# Altium footprint library Connectors SMD.PcbLib: 130 footprints (part 9 of 12)
Each footprint in its own frame and in the unit in brackets; x right, y up, seen from the top. Pads: shape width x height; smd on the part's side, far side on the other; paste and mask are expansions set on the pad; w line width, h text height; cw(c..) or ccw(c..) is an arc to the next point about the centre after c.
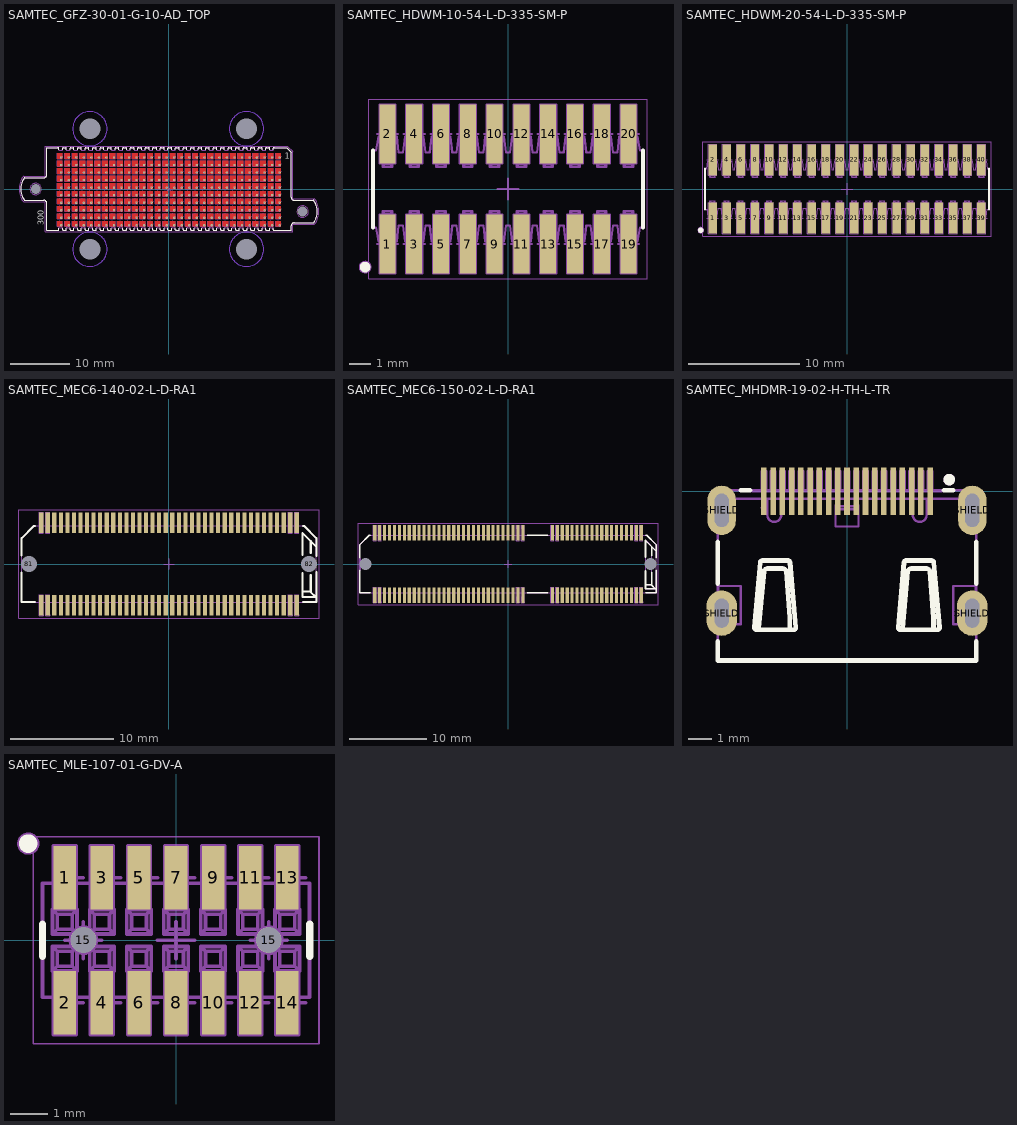
[diagram p8: the footprints below, top view; thin cyan lines are the x and y axes]

## SAMTEC_GFZ-30-01-G-10-AD_TOP [mm] "Z-Beam, High Speed 300 Pins, Pitch 1.27mm, Low Profile 1.65mm, Grid Array (30x10) Solderless SMT Board Stacking Connector"
height 1.65
pads (306):
  round 0.4 hole 0.2: 1(18.656,5.318) 2(18.656,4.048) 3(18.656,2.778) 4(18.656,1.508) 5(18.656,0.238) 6(18.656,-1.032) 7(18.656,-2.302) 8(18.656,-3.572) 9(18.656,-4.842) 10(18.656,-6.112) 11(17.386,5.318) 12(17.386,4.048) 13(17.386,2.778) 14(17.386,1.508) 15(17.386,0.238) 16(17.386,-1.032) 17(17.386,-2.302) 18(17.386,-3.572) 19(17.386,-4.842) 20(17.386,-6.112) 21(16.116,5.318) 22(16.116,4.048) 23(16.116,2.778) 24(16.116,1.508) 25(16.116,0.238) 26(16.116,-1.032) 27(16.116,-2.302) 28(16.116,-3.572) 29(16.116,-4.842) 30(16.116,-6.112) 31(14.825,5.3) 32(14.825,4.048) 33(14.825,2.778) 34(14.825,1.508) 35(14.825,0.238) 36(14.825,-1.032) 37(14.825,-2.302) 38(14.825,-3.572) 39(14.825,-4.842) 40(14.825,-6.112) 41(13.576,5.318) 42(13.576,4.048) 43(13.576,2.778) 44(13.576,1.508) 45(13.576,0.238) 46(13.576,-1.032) 47(13.576,-2.302) 48(13.576,-3.572) 49(13.576,-4.842) 50(13.576,-6.112) 51(12.306,5.318) 52(12.306,4.048) 53(12.306,2.778) 54(12.306,1.508) 55(12.306,0.238) 56(12.306,-1.032) 57(12.306,-2.302) 58(12.306,-3.572) 59(12.306,-4.842) 60(12.306,-6.112) 61(11.036,5.318) 62(11.036,4.048) 63(11.036,2.778) 64(11.036,1.508) 65(11.036,0.238) 66(11.036,-1.032) 67(11.036,-2.302) 68(11.036,-3.572) 69(11.036,-4.842) 70(11.036,-6.112) 71(9.766,5.318) 72(9.766,4.048) 73(9.766,2.778) 74(9.766,1.508) 75(9.766,0.238) 76(9.766,-1.032) 77(9.766,-2.302) 78(9.766,-3.572) 79(9.766,-4.842) 80(9.766,-6.112) 81(8.496,5.318) 82(8.496,4.048) 83(8.496,2.778) 84(8.496,1.508) 85(8.496,0.238) 86(8.496,-1.032) 87(8.496,-2.302) 88(8.496,-3.572) 89(8.496,-4.842) 90(8.496,-6.112) 91(7.226,5.318) 92(7.226,4.048) 93(7.226,2.778) 94(7.226,1.508) 95(7.226,0.238) 96(7.226,-1.032) 97(7.226,-2.302) 98(7.226,-3.572) 99(7.226,-4.842) 100(7.226,-6.112) 101(5.956,5.318) 102(5.956,4.048) 103(5.956,2.778) 104(5.956,1.508) 105(5.956,0.238) 106(5.956,-1.032) 107(5.956,-2.302) 108(5.956,-3.572) 109(5.956,-4.842) 110(5.956,-6.112) 111(4.686,5.318) 112(4.686,4.048) 113(4.686,2.778) 114(4.686,1.508) 115(4.686,0.238) 116(4.686,-1.032) 117(4.686,-2.302) 118(4.686,-3.572) 119(4.686,-4.842) 120(4.686,-6.112) 121(3.416,5.318) 122(3.416,4.048) 123(3.416,2.778) 124(3.416,1.508) 125(3.416,0.238) 126(3.416,-1.032) 127(3.416,-2.302) 128(3.416,-3.572) 129(3.416,-4.842) 130(3.416,-6.112) 131(2.146,5.318) 132(2.146,4.048) 133(2.146,2.778) 134(2.146,1.508) 135(2.146,0.238) 136(2.146,-1.032) 137(2.146,-2.302) 138(2.146,-3.572) 139(2.146,-4.842) 140(2.146,-6.112) 141(0.876,5.318) 142(0.876,4.048) 143(0.876,2.778) 144(0.876,1.508) 145(0.876,0.238) 146(0.876,-1.032) 147(0.876,-2.302) 148(0.876,-3.572) 149(0.876,-4.842) 150(0.876,-6.112) 151(-0.394,5.318) 152(-0.394,4.048) 153(-0.394,2.778) 154(-0.394,1.508) 155(-0.394,0.238) 156(-0.394,-1.032) 157(-0.394,-2.302) 158(-0.394,-3.572) 159(-0.394,-4.842) 160(-0.394,-6.112) 161(-1.664,5.318) 162(-1.664,4.048) 163(-1.664,2.778) 164(-1.664,1.508) 165(-1.664,0.238) 166(-1.664,-1.032) 167(-1.664,-2.302) 168(-1.664,-3.572) 169(-1.664,-4.842) 170(-1.664,-6.112) 171(-2.934,5.318) 172(-2.934,4.048) 173(-2.934,2.778) 174(-2.934,1.508) 175(-2.934,0.238) 176(-2.934,-1.032) 177(-2.934,-2.302) 178(-2.934,-3.572) 179(-2.934,-4.842) 180(-2.934,-6.112) 181(-4.204,5.318) 182(-4.204,4.048) 183(-4.204,2.778) 184(-4.204,1.508) 185(-4.204,0.238) 186(-4.204,-1.032) 187(-4.204,-2.302) 188(-4.204,-3.572) 189(-4.204,-4.842) 190(-4.204,-6.112) 191(-5.474,5.318) 192(-5.474,4.048) 193(-5.474,2.778) 194(-5.474,1.508) 195(-5.474,0.238) 196(-5.474,-1.032) 197(-5.474,-2.302) 198(-5.474,-3.572) 199(-5.474,-4.842) 200(-5.474,-6.112) 201(-6.744,5.318) 202(-6.744,4.048) 203(-6.744,2.778) 204(-6.744,1.508) 205(-6.744,0.238) 206(-6.744,-1.032) 207(-6.744,-2.302) 208(-6.744,-3.572) 209(-6.744,-4.842) 210(-6.744,-6.112) 211(-8.014,5.318) 212(-8.014,4.048) 213(-8.014,2.778) 214(-8.014,1.508) 215(-8.014,0.238) 216(-8.014,-1.032) 217(-8.014,-2.302) 218(-8.014,-3.572) 219(-8.014,-4.842) 220(-8.014,-6.112) 221(-9.284,5.318) 222(-9.284,4.048) 223(-9.284,2.778) 224(-9.284,1.508) 225(-9.284,0.238) 226(-9.284,-1.032) 227(-9.284,-2.302) 228(-9.284,-3.572) 229(-9.284,-4.842) 230(-9.284,-6.112) 231(-10.554,5.318) 232(-10.554,4.048) 233(-10.554,2.778) 234(-10.554,1.508) 235(-10.554,0.238) 236(-10.554,-1.032) 237(-10.554,-2.302) 238(-10.554,-3.572) 239(-10.554,-4.842) 240(-10.554,-6.112) 241(-11.824,5.318) 242(-11.824,4.048) 243(-11.824,2.778) 244(-11.824,1.508) 245(-11.824,0.238) 246(-11.824,-1.032) 247(-11.824,-2.302) 248(-11.824,-3.572) 249(-11.824,-4.842) 250(-11.824,-6.112) 251(-13.094,5.318) 252(-13.094,4.048) 253(-13.094,2.778) 254(-13.094,1.508) 255(-13.094,0.238) 256(-13.094,-1.032) 257(-13.094,-2.302) 258(-13.094,-3.572) 259(-13.094,-4.842) 260(-13.094,-6.112) 261(-14.364,5.318) 262(-14.364,4.048) 263(-14.364,2.778) 264(-14.364,1.508) 265(-14.364,0.238) 266(-14.364,-1.032) 267(-14.364,-2.302) 268(-14.364,-3.572) 269(-14.364,-4.842) 270(-14.364,-6.112) 271(-15.634,5.318) 272(-15.634,4.048) 273(-15.634,2.778) 274(-15.634,1.508) 275(-15.634,0.238) 276(-15.634,-1.032) 277(-15.634,-2.302) 278(-15.634,-3.572) 279(-15.634,-4.842) 280(-15.634,-6.112) 281(-16.904,5.318) 282(-16.904,4.048) 283(-16.904,2.778) 284(-16.904,1.508) 285(-16.904,0.238) 286(-16.904,-1.032) 287(-16.904,-2.302) 288(-16.904,-3.572) 289(-16.904,-4.842) 290(-16.904,-6.112) 291(-18.174,5.318) 292(-18.174,4.048) 293(-18.174,2.778) 294(-18.174,1.508) 295(-18.174,0.238) 296(-18.174,-1.032) 297(-18.174,-2.302) 298(-18.174,-3.572) 299(-18.174,-4.842) 300(-18.174,-6.112)
  round 1 hole 1.65 unplated mask+0.325: MEC1(-22.479,0) MEC2(22.53,-3.81)
  round 1 hole 3.5 unplated mask+1.25: MEC3(-13.339,10.16) MEC4(13.081,10.16) MEC5(-13.339,-10.16) MEC6(13.081,-10.16)
Top Layer:
  region: -18.864,6.008 -17.974,6.008 -17.974,5.118 -18.864,5.118
  region: -18.864,4.738 -17.974,4.738 -17.974,3.848 -18.864,3.848
  region: -18.864,3.468 -17.974,3.468 -17.974,2.578 -18.864,2.578
  region: -18.864,2.198 -17.974,2.198 -17.974,1.308 -18.864,1.308
  region: -18.864,0.928 -17.974,0.928 -17.974,0.038 -18.864,0.038
  region: -18.864,-0.342 -17.974,-0.342 -17.974,-1.232 -18.864,-1.232
  region: -18.864,-1.612 -17.974,-1.612 -17.974,-2.502 -18.864,-2.502
  region: -18.864,-2.882 -17.974,-2.882 -17.974,-3.772 -18.864,-3.772
  region: -18.864,-4.152 -17.974,-4.152 -17.974,-5.042 -18.864,-5.042
  region: -18.864,-5.422 -17.974,-5.422 -17.974,-6.312 -18.864,-6.312
  region: -17.594,6.008 -16.704,6.008 -16.704,5.118 -17.594,5.118
  region: -17.594,4.738 -16.704,4.738 -16.704,3.848 -17.594,3.848
  region: -17.594,3.468 -16.704,3.468 -16.704,2.578 -17.594,2.578
  region: -17.594,2.198 -16.704,2.198 -16.704,1.308 -17.594,1.308
  region: -17.594,0.928 -16.704,0.928 -16.704,0.038 -17.594,0.038
  region: -17.594,-0.342 -16.704,-0.342 -16.704,-1.232 -17.594,-1.232
  region: -17.594,-1.612 -16.704,-1.612 -16.704,-2.502 -17.594,-2.502
  region: -17.594,-2.882 -16.704,-2.882 -16.704,-3.772 -17.594,-3.772
  region: -17.594,-4.152 -16.704,-4.152 -16.704,-5.042 -17.594,-5.042
  region: -17.594,-5.422 -16.704,-5.422 -16.704,-6.312 -17.594,-6.312
  region: -16.324,6.008 -15.434,6.008 -15.434,5.118 -16.324,5.118
  region: -16.324,4.738 -15.434,4.738 -15.434,3.848 -16.324,3.848
  region: -16.324,3.468 -15.434,3.468 -15.434,2.578 -16.324,2.578
  region: -16.324,2.198 -15.434,2.198 -15.434,1.308 -16.324,1.308
  region: -16.324,0.928 -15.434,0.928 -15.434,0.038 -16.324,0.038
  region: -16.324,-0.342 -15.434,-0.342 -15.434,-1.232 -16.324,-1.232
  region: -16.324,-1.612 -15.434,-1.612 -15.434,-2.502 -16.324,-2.502
  region: -16.324,-2.882 -15.434,-2.882 -15.434,-3.772 -16.324,-3.772
  region: -16.324,-4.152 -15.434,-4.152 -15.434,-5.042 -16.324,-5.042
  region: -16.324,-5.422 -15.434,-5.422 -15.434,-6.312 -16.324,-6.312
  region: -15.054,6.008 -14.164,6.008 -14.164,5.118 -15.054,5.118
  region: -15.054,4.738 -14.164,4.738 -14.164,3.848 -15.054,3.848
  region: -15.054,3.468 -14.164,3.468 -14.164,2.578 -15.054,2.578
  region: -15.054,2.198 -14.164,2.198 -14.164,1.308 -15.054,1.308
  region: -15.054,0.928 -14.164,0.928 -14.164,0.038 -15.054,0.038
  region: -15.054,-0.342 -14.164,-0.342 -14.164,-1.232 -15.054,-1.232
  region: -15.054,-1.612 -14.164,-1.612 -14.164,-2.502 -15.054,-2.502
  region: -15.054,-2.882 -14.164,-2.882 -14.164,-3.772 -15.054,-3.772
  region: -15.054,-4.152 -14.164,-4.152 -14.164,-5.042 -15.054,-5.042
  region: -15.054,-5.422 -14.164,-5.422 -14.164,-6.312 -15.054,-6.312
  region: -13.784,6.008 -12.894,6.008 -12.894,5.118 -13.784,5.118
  region: -13.784,4.738 -12.894,4.738 -12.894,3.848 -13.784,3.848
  region: -13.784,3.468 -12.894,3.468 -12.894,2.578 -13.784,2.578
  region: -13.784,2.198 -12.894,2.198 -12.894,1.308 -13.784,1.308
  region: -13.784,0.928 -12.894,0.928 -12.894,0.038 -13.784,0.038
  region: -13.784,-0.342 -12.894,-0.342 -12.894,-1.232 -13.784,-1.232
  region: -13.784,-1.612 -12.894,-1.612 -12.894,-2.502 -13.784,-2.502
  region: -13.784,-2.882 -12.894,-2.882 -12.894,-3.772 -13.784,-3.772
  region: -13.784,-4.152 -12.894,-4.152 -12.894,-5.042 -13.784,-5.042
  region: -13.784,-5.422 -12.894,-5.422 -12.894,-6.312 -13.784,-6.312
  region: -12.514,6.008 -11.624,6.008 -11.624,5.118 -12.514,5.118
  region: -12.514,4.738 -11.624,4.738 -11.624,3.848 -12.514,3.848
  region: -12.514,3.468 -11.624,3.468 -11.624,2.578 -12.514,2.578
  region: -12.514,2.198 -11.624,2.198 -11.624,1.308 -12.514,1.308
  region: -12.514,0.928 -11.624,0.928 -11.624,0.038 -12.514,0.038
  region: -12.514,-0.342 -11.624,-0.342 -11.624,-1.232 -12.514,-1.232
  region: -12.514,-1.612 -11.624,-1.612 -11.624,-2.502 -12.514,-2.502
  region: -12.514,-2.882 -11.624,-2.882 -11.624,-3.772 -12.514,-3.772
  region: -12.514,-4.152 -11.624,-4.152 -11.624,-5.042 -12.514,-5.042
  region: -12.514,-5.422 -11.624,-5.422 -11.624,-6.312 -12.514,-6.312
  region: -11.244,6.008 -10.354,6.008 -10.354,5.118 -11.244,5.118
  region: -11.244,4.738 -10.354,4.738 -10.354,3.848 -11.244,3.848
  region: -11.244,3.468 -10.354,3.468 -10.354,2.578 -11.244,2.578
  region: -11.244,2.198 -10.354,2.198 -10.354,1.308 -11.244,1.308
  region: -11.244,0.928 -10.354,0.928 -10.354,0.038 -11.244,0.038
  region: -11.244,-0.342 -10.354,-0.342 -10.354,-1.232 -11.244,-1.232
  region: -11.244,-1.612 -10.354,-1.612 -10.354,-2.502 -11.244,-2.502
  region: -11.244,-2.882 -10.354,-2.882 -10.354,-3.772 -11.244,-3.772
  region: -11.244,-4.152 -10.354,-4.152 -10.354,-5.042 -11.244,-5.042
  region: -11.244,-5.422 -10.354,-5.422 -10.354,-6.312 -11.244,-6.312
  region: -9.974,6.008 -9.084,6.008 -9.084,5.118 -9.974,5.118
  region: -9.974,4.738 -9.084,4.738 -9.084,3.848 -9.974,3.848
  region: -9.974,3.468 -9.084,3.468 -9.084,2.578 -9.974,2.578
  region: -9.974,2.198 -9.084,2.198 -9.084,1.308 -9.974,1.308
  region: -9.974,0.928 -9.084,0.928 -9.084,0.038 -9.974,0.038
  region: -9.974,-0.342 -9.084,-0.342 -9.084,-1.232 -9.974,-1.232
  region: -9.974,-1.612 -9.084,-1.612 -9.084,-2.502 -9.974,-2.502
  region: -9.974,-2.882 -9.084,-2.882 -9.084,-3.772 -9.974,-3.772
  region: -9.974,-4.152 -9.084,-4.152 -9.084,-5.042 -9.974,-5.042
  region: -9.974,-5.422 -9.084,-5.422 -9.084,-6.312 -9.974,-6.312
  region: -8.704,6.008 -7.814,6.008 -7.814,5.118 -8.704,5.118
  region: -8.704,4.738 -7.814,4.738 -7.814,3.848 -8.704,3.848
  region: -8.704,3.468 -7.814,3.468 -7.814,2.578 -8.704,2.578
  region: -8.704,2.198 -7.814,2.198 -7.814,1.308 -8.704,1.308
  region: -8.704,0.928 -7.814,0.928 -7.814,0.038 -8.704,0.038
  region: -8.704,-0.342 -7.814,-0.342 -7.814,-1.232 -8.704,-1.232
  region: -8.704,-1.612 -7.814,-1.612 -7.814,-2.502 -8.704,-2.502
  region: -8.704,-2.882 -7.814,-2.882 -7.814,-3.772 -8.704,-3.772
  region: -8.704,-4.152 -7.814,-4.152 -7.814,-5.042 -8.704,-5.042
  region: -8.704,-5.422 -7.814,-5.422 -7.814,-6.312 -8.704,-6.312
  region: -7.434,6.008 -6.544,6.008 -6.544,5.118 -7.434,5.118
  region: -7.434,4.738 -6.544,4.738 -6.544,3.848 -7.434,3.848
  region: -7.434,3.468 -6.544,3.468 -6.544,2.578 -7.434,2.578
  region: -7.434,2.198 -6.544,2.198 -6.544,1.308 -7.434,1.308
  region: -7.434,0.928 -6.544,0.928 -6.544,0.038 -7.434,0.038
  region: -7.434,-0.342 -6.544,-0.342 -6.544,-1.232 -7.434,-1.232
  region: -7.434,-1.612 -6.544,-1.612 -6.544,-2.502 -7.434,-2.502
  region: -7.434,-2.882 -6.544,-2.882 -6.544,-3.772 -7.434,-3.772
  region: -7.434,-4.152 -6.544,-4.152 -6.544,-5.042 -7.434,-5.042
  region: -7.434,-5.422 -6.544,-5.422 -6.544,-6.312 -7.434,-6.312
  region: 17.966,-5.422 18.856,-5.422 18.856,-6.312 17.966,-6.312
  region: 17.966,6.008 18.856,6.008 18.856,5.118 17.966,5.118
  region: 16.696,6.008 17.586,6.008 17.586,5.118 16.696,5.118
  region: 15.426,6.008 16.316,6.008 16.316,5.118 15.426,5.118
  region: 14.156,6.008 15.046,6.008 15.046,5.118 14.156,5.118
  region: 12.886,6.008 13.776,6.008 13.776,5.118 12.886,5.118
  region: 11.616,6.008 12.506,6.008 12.506,5.118 11.616,5.118
  region: 10.346,6.008 11.236,6.008 11.236,5.118 10.346,5.118
  region: 9.076,6.008 9.966,6.008 9.966,5.118 9.076,5.118
  region: 7.806,6.008 8.696,6.008 8.696,5.118 7.806,5.118
  region: 6.536,6.008 7.426,6.008 7.426,5.118 6.536,5.118
  region: 5.266,6.008 6.156,6.008 6.156,5.118 5.266,5.118
  region: 3.996,6.008 4.886,6.008 4.886,5.118 3.996,5.118
  region: 2.726,6.008 3.616,6.008 3.616,5.118 2.726,5.118
  region: 1.456,6.008 2.346,6.008 2.346,5.118 1.456,5.118
  region: 0.186,6.008 1.076,6.008 1.076,5.118 0.186,5.118
  region: -1.084,6.008 -0.194,6.008 -0.194,5.118 -1.084,5.118
  region: -2.354,6.008 -1.464,6.008 -1.464,5.118 -2.354,5.118
  region: -3.624,6.008 -2.734,6.008 -2.734,5.118 -3.624,5.118
  region: -4.894,6.008 -4.004,6.008 -4.004,5.118 -4.894,5.118
  region: -6.164,6.008 -5.274,6.008 -5.274,5.118 -6.164,5.118
  region: 17.966,4.738 18.856,4.738 18.856,3.848 17.966,3.848
  region: 16.696,4.738 17.586,4.738 17.586,3.848 16.696,3.848
  region: 15.426,4.738 16.316,4.738 16.316,3.848 15.426,3.848
  region: 14.156,4.738 15.046,4.738 15.046,3.848 14.156,3.848
  region: 12.886,4.738 13.776,4.738 13.776,3.848 12.886,3.848
  region: 11.616,4.738 12.506,4.738 12.506,3.848 11.616,3.848
  region: 10.346,4.738 11.236,4.738 11.236,3.848 10.346,3.848
  region: 9.076,4.738 9.966,4.738 9.966,3.848 9.076,3.848
  region: 7.806,4.738 8.696,4.738 8.696,3.848 7.806,3.848
  region: 6.536,4.738 7.426,4.738 7.426,3.848 6.536,3.848
  region: 5.266,4.738 6.156,4.738 6.156,3.848 5.266,3.848
  region: 3.996,4.738 4.886,4.738 4.886,3.848 3.996,3.848
  region: 2.726,4.738 3.616,4.738 3.616,3.848 2.726,3.848
  region: 1.456,4.738 2.346,4.738 2.346,3.848 1.456,3.848
  region: 0.186,4.738 1.076,4.738 1.076,3.848 0.186,3.848
  region: -1.084,4.738 -0.194,4.738 -0.194,3.848 -1.084,3.848
  region: -2.354,4.738 -1.464,4.738 -1.464,3.848 -2.354,3.848
  region: -3.624,4.738 -2.734,4.738 -2.734,3.848 -3.624,3.848
  region: -4.894,4.738 -4.004,4.738 -4.004,3.848 -4.894,3.848
  region: -6.164,4.738 -5.274,4.738 -5.274,3.848 -6.164,3.848
  region: 17.966,3.468 18.856,3.468 18.856,2.578 17.966,2.578
  region: 16.696,3.468 17.586,3.468 17.586,2.578 16.696,2.578
  region: 15.426,3.468 16.316,3.468 16.316,2.578 15.426,2.578
  region: 14.156,3.468 15.046,3.468 15.046,2.578 14.156,2.578
  region: 12.886,3.468 13.776,3.468 13.776,2.578 12.886,2.578
  region: 11.616,3.468 12.506,3.468 12.506,2.578 11.616,2.578
  region: 10.346,3.468 11.236,3.468 11.236,2.578 10.346,2.578
  region: 9.076,3.468 9.966,3.468 9.966,2.578 9.076,2.578
  region: 7.806,3.468 8.696,3.468 8.696,2.578 7.806,2.578
  region: 6.536,3.468 7.426,3.468 7.426,2.578 6.536,2.578
  region: 5.266,3.468 6.156,3.468 6.156,2.578 5.266,2.578
  region: 3.996,3.468 4.886,3.468 4.886,2.578 3.996,2.578
  region: 2.726,3.468 3.616,3.468 3.616,2.578 2.726,2.578
  region: 1.456,3.468 2.346,3.468 2.346,2.578 1.456,2.578
  region: 0.186,3.468 1.076,3.468 1.076,2.578 0.186,2.578
  region: -1.084,3.468 -0.194,3.468 -0.194,2.578 -1.084,2.578
  region: -2.354,3.468 -1.464,3.468 -1.464,2.578 -2.354,2.578
  region: -3.624,3.468 -2.734,3.468 -2.734,2.578 -3.624,2.578
  region: -4.894,3.468 -4.004,3.468 -4.004,2.578 -4.894,2.578
  region: -6.164,3.468 -5.274,3.468 -5.274,2.578 -6.164,2.578
  region: 17.966,2.198 18.856,2.198 18.856,1.308 17.966,1.308
  region: 16.696,2.198 17.586,2.198 17.586,1.308 16.696,1.308
  region: 15.426,2.198 16.316,2.198 16.316,1.308 15.426,1.308
  region: 14.156,2.198 15.046,2.198 15.046,1.308 14.156,1.308
  region: 12.886,2.198 13.776,2.198 13.776,1.308 12.886,1.308
  region: 11.616,2.198 12.506,2.198 12.506,1.308 11.616,1.308
  region: 10.346,2.198 11.236,2.198 11.236,1.308 10.346,1.308
  region: 9.076,2.198 9.966,2.198 9.966,1.308 9.076,1.308
  region: 7.806,2.198 8.696,2.198 8.696,1.308 7.806,1.308
  region: 6.536,2.198 7.426,2.198 7.426,1.308 6.536,1.308
  region: 5.266,2.198 6.156,2.198 6.156,1.308 5.266,1.308
  region: 3.996,2.198 4.886,2.198 4.886,1.308 3.996,1.308
  region: 2.726,2.198 3.616,2.198 3.616,1.308 2.726,1.308
  region: 1.456,2.198 2.346,2.198 2.346,1.308 1.456,1.308
  region: 0.186,2.198 1.076,2.198 1.076,1.308 0.186,1.308
  region: -1.084,2.198 -0.194,2.198 -0.194,1.308 -1.084,1.308
  region: -2.354,2.198 -1.464,2.198 -1.464,1.308 -2.354,1.308
  region: -3.624,2.198 -2.734,2.198 -2.734,1.308 -3.624,1.308
  region: -4.894,2.198 -4.004,2.198 -4.004,1.308 -4.894,1.308
  region: -6.164,2.198 -5.274,2.198 -5.274,1.308 -6.164,1.308
  region: 17.966,0.928 18.856,0.928 18.856,0.038 17.966,0.038
  region: 16.696,0.928 17.586,0.928 17.586,0.038 16.696,0.038
  region: 15.426,0.928 16.316,0.928 16.316,0.038 15.426,0.038
  region: 14.156,0.928 15.046,0.928 15.046,0.038 14.156,0.038
  region: 12.886,0.928 13.776,0.928 13.776,0.038 12.886,0.038
  region: 11.616,0.928 12.506,0.928 12.506,0.038 11.616,0.038
  region: 10.346,0.928 11.236,0.928 11.236,0.038 10.346,0.038
  region: 9.076,0.928 9.966,0.928 9.966,0.038 9.076,0.038
  region: 7.806,0.928 8.696,0.928 8.696,0.038 7.806,0.038
  region: 6.536,0.928 7.426,0.928 7.426,0.038 6.536,0.038
  region: 5.266,0.928 6.156,0.928 6.156,0.038 5.266,0.038
  region: 3.996,0.928 4.886,0.928 4.886,0.038 3.996,0.038
  region: 2.726,0.928 3.616,0.928 3.616,0.038 2.726,0.038
  region: 1.456,0.928 2.346,0.928 2.346,0.038 1.456,0.038
  region: 0.186,0.928 1.076,0.928 1.076,0.038 0.186,0.038
  region: -1.084,0.928 -0.194,0.928 -0.194,0.038 -1.084,0.038
  region: -2.354,0.928 -1.464,0.928 -1.464,0.038 -2.354,0.038
  region: -3.624,0.928 -2.734,0.928 -2.734,0.038 -3.624,0.038
  region: -4.894,0.928 -4.004,0.928 -4.004,0.038 -4.894,0.038
  region: -6.164,0.928 -5.274,0.928 -5.274,0.038 -6.164,0.038
  region: 17.966,-0.342 18.856,-0.342 18.856,-1.232 17.966,-1.232
  region: 16.696,-0.342 17.586,-0.342 17.586,-1.232 16.696,-1.232
  region: 15.426,-0.342 16.316,-0.342 16.316,-1.232 15.426,-1.232
  region: 14.156,-0.342 15.046,-0.342 15.046,-1.232 14.156,-1.232
  region: 12.886,-0.342 13.776,-0.342 13.776,-1.232 12.886,-1.232
  region: 11.616,-0.342 12.506,-0.342 12.506,-1.232 11.616,-1.232
  region: 10.346,-0.342 11.236,-0.342 11.236,-1.232 10.346,-1.232
  region: 9.076,-0.342 9.966,-0.342 9.966,-1.232 9.076,-1.232
  region: 7.806,-0.342 8.696,-0.342 8.696,-1.232 7.806,-1.232
  region: 6.536,-0.342 7.426,-0.342 7.426,-1.232 6.536,-1.232
  region: 5.266,-0.342 6.156,-0.342 6.156,-1.232 5.266,-1.232
  region: 3.996,-0.342 4.886,-0.342 4.886,-1.232 3.996,-1.232
  region: 2.726,-0.342 3.616,-0.342 3.616,-1.232 2.726,-1.232
  region: 1.456,-0.342 2.346,-0.342 2.346,-1.232 1.456,-1.232
  region: 0.186,-0.342 1.076,-0.342 1.076,-1.232 0.186,-1.232
  region: -1.084,-0.342 -0.194,-0.342 -0.194,-1.232 -1.084,-1.232
  region: -2.354,-0.342 -1.464,-0.342 -1.464,-1.232 -2.354,-1.232
  region: -3.624,-0.342 -2.734,-0.342 -2.734,-1.232 -3.624,-1.232
  region: -4.894,-0.342 -4.004,-0.342 -4.004,-1.232 -4.894,-1.232
  region: -6.164,-0.342 -5.274,-0.342 -5.274,-1.232 -6.164,-1.232
  region: 17.966,-1.612 18.856,-1.612 18.856,-2.502 17.966,-2.502
  region: 16.696,-1.612 17.586,-1.612 17.586,-2.502 16.696,-2.502
  region: 15.426,-1.612 16.316,-1.612 16.316,-2.502 15.426,-2.502
  region: 14.156,-1.612 15.046,-1.612 15.046,-2.502 14.156,-2.502
  region: 12.886,-1.612 13.776,-1.612 13.776,-2.502 12.886,-2.502
  region: 11.616,-1.612 12.506,-1.612 12.506,-2.502 11.616,-2.502
  region: 10.346,-1.612 11.236,-1.612 11.236,-2.502 10.346,-2.502
  region: 9.076,-1.612 9.966,-1.612 9.966,-2.502 9.076,-2.502
  region: 7.806,-1.612 8.696,-1.612 8.696,-2.502 7.806,-2.502
  region: 6.536,-1.612 7.426,-1.612 7.426,-2.502 6.536,-2.502
  region: 5.266,-1.612 6.156,-1.612 6.156,-2.502 5.266,-2.502
  region: 3.996,-1.612 4.886,-1.612 4.886,-2.502 3.996,-2.502
  region: 2.726,-1.612 3.616,-1.612 3.616,-2.502 2.726,-2.502
  region: 1.456,-1.612 2.346,-1.612 2.346,-2.502 1.456,-2.502
  region: 0.186,-1.612 1.076,-1.612 1.076,-2.502 0.186,-2.502
  region: -1.084,-1.612 -0.194,-1.612 -0.194,-2.502 -1.084,-2.502
  region: -2.354,-1.612 -1.464,-1.612 -1.464,-2.502 -2.354,-2.502
  region: -3.624,-1.612 -2.734,-1.612 -2.734,-2.502 -3.624,-2.502
  region: -4.894,-1.612 -4.004,-1.612 -4.004,-2.502 -4.894,-2.502
  region: -6.164,-1.612 -5.274,-1.612 -5.274,-2.502 -6.164,-2.502
  region: 17.966,-2.882 18.856,-2.882 18.856,-3.772 17.966,-3.772
  region: 16.696,-2.882 17.586,-2.882 17.586,-3.772 16.696,-3.772
  region: 15.426,-2.882 16.316,-2.882 16.316,-3.772 15.426,-3.772
  region: 14.156,-2.882 15.046,-2.882 15.046,-3.772 14.156,-3.772
  region: 12.886,-2.882 13.776,-2.882 13.776,-3.772 12.886,-3.772
  region: 11.616,-2.882 12.506,-2.882 12.506,-3.772 11.616,-3.772
  region: 10.346,-2.882 11.236,-2.882 11.236,-3.772 10.346,-3.772
  region: 9.076,-2.882 9.966,-2.882 9.966,-3.772 9.076,-3.772
  region: 7.806,-2.882 8.696,-2.882 8.696,-3.772 7.806,-3.772
  region: 6.536,-2.882 7.426,-2.882 7.426,-3.772 6.536,-3.772
  region: 5.266,-2.882 6.156,-2.882 6.156,-3.772 5.266,-3.772
  region: 3.996,-2.882 4.886,-2.882 4.886,-3.772 3.996,-3.772
  region: 2.726,-2.882 3.616,-2.882 3.616,-3.772 2.726,-3.772
  region: 1.456,-2.882 2.346,-2.882 2.346,-3.772 1.456,-3.772
  region: 0.186,-2.882 1.076,-2.882 1.076,-3.772 0.186,-3.772
  region: -1.084,-2.882 -0.194,-2.882 -0.194,-3.772 -1.084,-3.772
  region: -2.354,-2.882 -1.464,-2.882 -1.464,-3.772 -2.354,-3.772
  region: -3.624,-2.882 -2.734,-2.882 -2.734,-3.772 -3.624,-3.772
  region: -4.894,-2.882 -4.004,-2.882 -4.004,-3.772 -4.894,-3.772
  region: -6.164,-2.882 -5.274,-2.882 -5.274,-3.772 -6.164,-3.772
  region: 17.966,-4.152 18.856,-4.152 18.856,-5.042 17.966,-5.042
  region: 16.696,-4.152 17.586,-4.152 17.586,-5.042 16.696,-5.042
  region: 15.426,-4.152 16.316,-4.152 16.316,-5.042 15.426,-5.042
  region: 14.156,-4.152 15.046,-4.152 15.046,-5.042 14.156,-5.042
  region: 12.886,-4.152 13.776,-4.152 13.776,-5.042 12.886,-5.042
  region: 11.616,-4.152 12.506,-4.152 12.506,-5.042 11.616,-5.042
  region: 10.346,-4.152 11.236,-4.152 11.236,-5.042 10.346,-5.042
  region: 9.076,-4.152 9.966,-4.152 9.966,-5.042 9.076,-5.042
  region: 7.806,-4.152 8.696,-4.152 8.696,-5.042 7.806,-5.042
  region: 6.536,-4.152 7.426,-4.152 7.426,-5.042 6.536,-5.042
  region: 5.266,-4.152 6.156,-4.152 6.156,-5.042 5.266,-5.042
  region: 3.996,-4.152 4.886,-4.152 4.886,-5.042 3.996,-5.042
  region: 2.726,-4.152 3.616,-4.152 3.616,-5.042 2.726,-5.042
  region: 1.456,-4.152 2.346,-4.152 2.346,-5.042 1.456,-5.042
  region: 0.186,-4.152 1.076,-4.152 1.076,-5.042 0.186,-5.042
  region: -1.084,-4.152 -0.194,-4.152 -0.194,-5.042 -1.084,-5.042
  region: -2.354,-4.152 -1.464,-4.152 -1.464,-5.042 -2.354,-5.042
  region: -3.624,-4.152 -2.734,-4.152 -2.734,-5.042 -3.624,-5.042
  region: -4.894,-4.152 -4.004,-4.152 -4.004,-5.042 -4.894,-5.042
  region: -6.164,-4.152 -5.274,-4.152 -5.274,-5.042 -6.164,-5.042
  region: 16.696,-5.422 17.586,-5.422 17.586,-6.312 16.696,-6.312
  region: 15.426,-5.422 16.316,-5.422 16.316,-6.312 15.426,-6.312
  region: 14.156,-5.422 15.046,-5.422 15.046,-6.312 14.156,-6.312
  region: 12.886,-5.422 13.776,-5.422 13.776,-6.312 12.886,-6.312
  region: 11.616,-5.422 12.506,-5.422 12.506,-6.312 11.616,-6.312
  region: 10.346,-5.422 11.236,-5.422 11.236,-6.312 10.346,-6.312
  region: 9.076,-5.422 9.966,-5.422 9.966,-6.312 9.076,-6.312
  region: 7.806,-5.422 8.696,-5.422 8.696,-6.312 7.806,-6.312
  region: 6.536,-5.422 7.426,-5.422 7.426,-6.312 6.536,-6.312
  region: 5.266,-5.422 6.156,-5.422 6.156,-6.312 5.266,-6.312
  region: 3.996,-5.422 4.886,-5.422 4.886,-6.312 3.996,-6.312
  region: 2.726,-5.422 3.616,-5.422 3.616,-6.312 2.726,-6.312
  region: 1.456,-5.422 2.346,-5.422 2.346,-6.312 1.456,-6.312
  region: 0.186,-5.422 1.076,-5.422 1.076,-6.312 0.186,-6.312
  region: -1.084,-5.422 -0.194,-5.422 -0.194,-6.312 -1.084,-6.312
  region: -2.354,-5.422 -1.464,-5.422 -1.464,-6.312 -2.354,-6.312
  region: -3.624,-5.422 -2.734,-5.422 -2.734,-6.312 -3.624,-6.312
  region: -4.894,-5.422 -4.004,-5.422 -4.004,-6.312 -4.894,-6.312
  region: -6.164,-5.422 -5.274,-5.422 -5.274,-6.312 -6.164,-6.312
Bottom Layer keep-out:
  circle w0.1: c13.081,-10.16 r2.9
  circle w0.1: c13.081,10.16 r2.9
  circle w0.1: c-13.339,-10.16 r2.9
  circle w0.1: c-13.339,10.16 r2.9
Top Overlay:
  drawing of 311 lines, arcs and shapes, not listed
  text "300" at -21.131,-6.085 h1
  text "1" at 19.535,5.106 h1
Mechanical 8:
  drawing of 3026 lines, arcs and shapes, not listed
Mechanical 14:
  drawing of 487 lines, arcs and shapes, not listed
  text "300" at -21.131,-6.085 h1
  text "1" at 19.535,5.106 h1
Mechanical 15:
  lines w0.05: -24.531,-2.155 cw(c-21.869,0) -24.531,2.155 -20.849,2.155 -20.849,7.235 19.941,7.235 20.849,6.327 20.849,-1.655 24.531,-1.655 cw(c21.869,-3.81) 24.531,-5.965 20.849,-5.965 20.849,-7.235 -20.849,-7.235 -20.849,-2.155 -24.531,-2.155
3D body: height 2.92, standoff -1.27, extent -25.037,-6.985 25.037,6.985

## SAMTEC_HDWM-10-54-L-D-335-SM-P [mm] "20 Contacts - Pitch 1.27mm - Dual Row Straight SMD Micro Board Stacker"
height 11.05
pads (20):
  rect 0.76x2.79 smd: 1(-5.715,-2.615) 2(-5.715,2.615) 3(-4.445,-2.615) 4(-4.445,2.615) 5(-3.175,-2.615) 6(-3.175,2.615) 7(-1.905,-2.615) 8(-1.905,2.615) 9(-0.635,-2.615) 10(-0.635,2.615) 11(0.635,-2.615) 12(0.635,2.615) 13(1.905,-2.615) 14(1.905,2.615) 15(3.175,-2.615) 16(3.175,2.615) 17(4.445,-2.615) 18(4.445,2.615) 19(5.715,-2.615) 20(5.715,2.615)
Top Overlay:
  circle w0.25: c-6.775,-3.7 r0.125
  circle w0.25: c-6.775,-3.7 r0.125
  lines w0.2: -6.395,-1.829 -6.395,1.829 ; 6.395,-1.829 6.395,1.829
Mechanical 8:
  drawing of 164 lines, arcs and shapes, not listed
Mechanical 14:
  drawing of 343 lines, arcs and shapes, not listed
Mechanical 15:
  lines w0.05: -6.6,-4.26 6.6,-4.26 6.6,4.26 -6.6,4.26 -6.6,-4.26
3D body: height 11.05, standoff 0, extent -6.35,-3.759 6.35,3.759

## SAMTEC_HDWM-20-54-L-D-335-SM-P [mm] "40 Contacts - Pitch 1.27mm - Dual Row Straight SMD Micro Board Stacker"
height 11.05
pads (40):
  rect 0.76x2.79 smd: 1(-12.065,-2.615) 2(-12.065,2.615) 3(-10.795,-2.615) 4(-10.795,2.615) 5(-9.525,-2.615) 6(-9.525,2.615) 7(-8.255,-2.615) 8(-8.255,2.615) 9(-6.985,-2.615) 10(-6.985,2.615) 11(-5.715,-2.615) 12(-5.715,2.615) 13(-4.445,-2.615) 14(-4.445,2.615) 15(-3.175,-2.615) 16(-3.175,2.615) 17(-1.905,-2.615) 18(-1.905,2.615) 19(-0.635,-2.615) 20(-0.635,2.615) 21(0.635,-2.615) 22(0.635,2.615) 23(1.905,-2.615) 24(1.905,2.615) 25(3.175,-2.615) 26(3.175,2.615) 27(4.445,-2.615) 28(4.445,2.615) 29(5.715,-2.615) 30(5.715,2.615) 31(6.985,-2.615) 32(6.985,2.615) 33(8.255,-2.615) 34(8.255,2.615) 35(9.525,-2.615) 36(9.525,2.615) 37(10.795,-2.615) 38(10.795,2.615) 39(12.065,-2.615) 40(12.065,2.615)
Top Overlay:
  circle w0.25: c-13.125,-3.7 r0.125
  circle w0.25: c-13.125,-3.7 r0.125
  lines w0.2: -12.745,-1.829 -12.745,1.829 ; 12.745,-1.829 12.745,1.829
Mechanical 8:
  drawing of 324 lines, arcs and shapes, not listed
Mechanical 14:
  drawing of 683 lines, arcs and shapes, not listed
Mechanical 15:
  lines w0.05: -12.95,-4.26 -12.95,4.26 12.95,4.26 12.95,-4.26 -12.95,-4.26
3D body: height 11.05, standoff 0, extent -12.7,-3.759 12.7,3.759

## SAMTEC_MEC6-140-02-L-D-RA1 [mm] "80 Contacts, Pitch 0.635mm, Right Angle Micro Edge Card Socket"
height 5.78
pads (82):
  rect 0.4x2 smd mask+0: 1(-12.382,-4) 2(-12.382,4) 3(-11.747,-4) 4(-11.747,4) 5(-11.112,-4) 6(-11.112,4) 7(-10.477,-4) 8(-10.477,4) 9(-9.842,-4) 10(-9.842,4) 11(-9.207,-4) 12(-9.207,4) 13(-8.572,-4) 14(-8.572,4) 15(-7.937,-4) 16(-7.937,4) 17(-7.302,-4) 18(-7.302,4) 19(-6.667,-4) 20(-6.667,4) 21(-6.032,-4) 22(-6.032,4) 23(-5.397,-4) 24(-5.397,4) 25(-4.762,-4) 26(-4.762,4) 27(-4.127,-4) 28(-4.127,4) 29(-3.492,-4) 30(-3.492,4) 31(-2.857,-4) 32(-2.857,4) 33(-2.222,-4) 34(-2.222,4) 35(-1.587,-4) 36(-1.587,4) 37(-0.952,-4) 38(-0.952,4) 39(-0.317,-4) 40(-0.317,4) 41(0.318,-4) 42(0.318,4) 43(0.953,-4) 44(0.953,4) 45(1.588,-4) 46(1.588,4) 47(2.223,-4) 48(2.223,4) 49(2.858,-4) 50(2.858,4) 51(3.493,-4) 52(3.493,4) 53(4.128,-4) 54(4.128,4) 55(4.763,-4) 56(4.763,4) 57(5.398,-4) 58(5.398,4) 59(6.033,-4) 60(6.033,4) 61(6.668,-4) 62(6.668,4) 63(7.303,-4) 64(7.303,4) 65(7.938,-4) 66(7.938,4) 67(8.573,-4) 68(8.573,4) 69(9.208,-4) 70(9.208,4) 71(9.843,-4) 72(9.843,4) 73(10.478,-4) 74(10.478,4) 75(11.113,-4) 76(11.113,4) 77(11.748,-4) 78(11.748,4) 79(12.383,-4) 80(12.383,4)
  round 1 hole 1.55 unplated mask+0.275: 81(-13.582,0) 82(13.583,0)
Top Overlay:
  lines w0.2: -14.282,-0.816 -14.282,-3.7 -12.982,-3.7 ; -14.282,0.816 -14.282,2.5 -13.082,3.7 -12.982,3.7 ; 12.925,-2.65 13.733,-2.65 ; 12.925,-0.87 12.925,-3.2 14.208,-3.2 13.733,-2.725 13.733,-1.06 ; 12.925,0.87 12.925,3.023 14.283,1.666 ; 12.983,-3.7 14.283,-3.7 14.283,-0.792 ; 12.983,3.7 13.083,3.7 14.283,2.5 14.283,0.792 ; 13.733,1.06 13.733,2.216
Mechanical 8:
  lines w0.1: -14.082,0 -13.582,0 ; -13.582,-0.5 -13.582,0 ; -13.582,0.5 -13.582,0 ; -13.082,0 -13.582,0 ; -0.5,0 0,0 ; 0,-0.5 0,0 ; 0,0.5 0,0 ; 0.5,0 0,0 ; 13.083,0 13.583,0 ; 13.583,-0.5 13.583,0 ; 13.583,0.5 13.583,0 ; 14.083,0 13.583,0 ; -12.582,-5 -12.182,-5 ; -12.582,-5 -12.582,-3 -12.182,-3 -12.182,-5 ; -12.582,-5 -12.382,-4 -12.182,-5 ; -12.582,5 -12.182,5 ; -12.582,5 -12.582,3 -12.182,3 -12.182,5 ; -12.582,5 -12.382,4 -12.182,5 ; -11.947,-5 -11.547,-5 ; -11.947,-5 -11.947,-3 -11.547,-3 -11.547,-5 ; -11.947,-5 -11.747,-4 -11.547,-5 ; -11.947,5 -11.547,5 ; -11.947,5 -11.947,3 -11.547,3 -11.547,5 ; -11.947,5 -11.747,4 -11.547,5 ; 11.548,-5 11.948,-5 ; 11.548,-5 11.548,-3 11.948,-3 11.948,-5 ; 11.548,-5 11.748,-4 11.948,-5 ; 11.548,5 11.948,5 ; 11.548,5 11.548,3 11.948,3 11.948,5 ; 11.548,5 11.748,4 11.948,5 ; 12.183,-5 12.583,-5 ; 12.183,-5 12.183,-3 12.583,-3 12.583,-5 ; 12.183,-5 12.383,-4 12.583,-5 ; 12.183,5 12.583,5 ; 12.183,5 12.183,3 12.583,3 12.583,5 ; 12.183,5 12.383,4 12.583,5
Mechanical 14:
  lines w0.1: -14.282,-3.7 -14.282,2.5 -13.082,3.7 13.083,3.7 14.283,2.5 14.283,-3.7 -14.282,-3.7
Mechanical 15:
  lines w0.05: -14.532,-5.25 -14.532,5.25 14.533,5.25 14.533,-5.25 -14.532,-5.25
3D body: height 5.77, standoff -1.05, extent -14.282,-4.55 14.283,4.55

## SAMTEC_MEC6-150-02-L-D-RA1 [mm] "100 Contacts, Pitch 0.635mm, Right Angle Micro Edge Card Socket"
height 5.78
pads (102):
  rect 0.4x2 smd mask+0: 1(-17.145,-4) 2(-17.145,4) 3(-16.51,-4) 4(-16.51,4) 5(-15.875,-4) 6(-15.875,4) 7(-15.24,-4) 8(-15.24,4) 9(-14.605,-4) 10(-14.605,4) 11(-13.97,-4) 12(-13.97,4) 13(-13.335,-4) 14(-13.335,4) 15(-12.7,-4) 16(-12.7,4) 17(-12.065,-4) 18(-12.065,4) 19(-11.43,-4) 20(-11.43,4) 21(-10.795,-4) 22(-10.795,4) 23(-10.16,-4) 24(-10.16,4) 25(-9.525,-4) 26(-9.525,4) 27(-8.89,-4) 28(-8.89,4) 29(-8.255,-4) 30(-8.255,4) 31(-7.62,-4) 32(-7.62,4) 33(-6.985,-4) 34(-6.985,4) 35(-6.35,-4) 36(-6.35,4) 37(-5.715,-4) 38(-5.715,4) 39(-5.08,-4) 40(-5.08,4) 41(-4.445,-4) 42(-4.445,4) 43(-3.81,-4) 44(-3.81,4) 45(-3.175,-4) 46(-3.175,4) 47(-2.54,-4) 48(-2.54,4) 49(-1.905,-4) 50(-1.905,4) 51(-1.27,-4) 52(-1.27,4) 53(-0.635,-4) 54(-0.635,4) 55(0,-4) 56(0,4) 57(0.635,-4) 58(0.635,4) 59(1.27,-4) 60(1.27,4) 61(1.905,-4) 62(1.905,4) 63(5.715,-4) 64(5.715,4) 65(6.35,-4) 66(6.35,4) 67(6.985,-4) 68(6.985,4) 69(7.62,-4) 70(7.62,4) 71(8.255,-4) 72(8.255,4) 73(8.89,-4) 74(8.89,4) 75(9.525,-4) 76(9.525,4) 77(10.16,-4) 78(10.16,4) 79(10.795,-4) 80(10.795,4) 81(11.43,-4) 82(11.43,4) 83(12.065,-4) 84(12.065,4) 85(12.7,-4) 86(12.7,4) 87(13.335,-4) 88(13.335,4) 89(13.97,-4) 90(13.97,4) 91(14.605,-4) 92(14.605,4) 93(15.24,-4) 94(15.24,4) 95(15.875,-4) 96(15.875,4) 97(16.51,-4) 98(16.51,4) 99(17.145,-4) 100(17.145,4)
  round 1 hole 1.55 unplated mask+0.275: 101(-18.345,0) 102(18.345,0)
Top Overlay:
  lines w0.2: -19.045,-0.816 -19.045,-3.7 -17.745,-3.7 ; -19.045,0.816 -19.045,2.5 -17.845,3.7 -17.745,3.7 ; 2.505,-3.7 5.115,-3.7 ; 2.505,3.7 5.115,3.7 ; 17.688,-2.65 18.495,-2.65 ; 17.688,-0.87 17.688,-3.2 18.97,-3.2 18.495,-2.725 18.495,-1.06 ; 17.688,0.87 17.688,3.023 19.045,1.666 ; 17.745,-3.7 19.045,-3.7 19.045,-0.792 ; 17.745,3.7 17.845,3.7 19.045,2.5 19.045,0.792 ; 18.495,1.06 18.495,2.216
Mechanical 8:
  lines w0.1: -18.845,0 -18.345,0 ; -18.345,-0.5 -18.345,0 ; -18.345,0.5 -18.345,0 ; -17.845,0 -18.345,0 ; -0.5,0 0,0 ; 0,-0.5 0,0 ; 0,0.5 0,0 ; 0.5,0 0,0 ; 17.845,0 18.345,0 ; 18.345,-0.5 18.345,0 ; 18.345,0.5 18.345,0 ; 18.845,0 18.345,0 ; -17.345,-5 -17.145,-4 -16.945,-5 ; -17.345,-5 -17.345,-3 -16.945,-3 -16.945,-5 ; -17.345,-5 -16.945,-5 ; -17.345,5 -17.145,4 -16.945,5 ; -17.345,5 -17.345,3 -16.945,3 -16.945,5 ; -17.345,5 -16.945,5 ; -16.71,-5 -16.51,-4 -16.31,-5 ; -16.71,-5 -16.71,-3 -16.31,-3 -16.31,-5 ; -16.71,-5 -16.31,-5 ; -16.71,5 -16.51,4 -16.31,5 ; -16.71,5 -16.71,3 -16.31,3 -16.31,5 ; -16.71,5 -16.31,5 ; 1.07,-5 1.27,-4 1.47,-5 ; 1.07,-5 1.07,-3 1.47,-3 1.47,-5 ; 1.07,-5 1.47,-5 ; 1.07,5 1.27,4 1.47,5 ; 1.07,5 1.07,3 1.47,3 1.47,5 ; 1.07,5 1.47,5 ; 1.705,-5 1.905,-4 2.105,-5 ; 1.705,-5 1.705,-3 2.105,-3 2.105,-5 ; 1.705,-5 2.105,-5 ; 1.705,5 1.905,4 2.105,5 ; 1.705,5 1.705,3 2.105,3 2.105,5 ; 1.705,5 2.105,5 ; 5.515,-5 5.715,-4 5.915,-5 ; 5.515,-5 5.515,-3 5.915,-3 5.915,-5 ; 5.515,-5 5.915,-5 ; 5.515,5 5.715,4 5.915,5 ; 5.515,5 5.515,3 5.915,3 5.915,5 ; 5.515,5 5.915,5 ; 6.15,-5 6.35,-4 6.55,-5 ; 6.15,-5 6.15,-3 6.55,-3 6.55,-5 ; 6.15,-5 6.55,-5 ; 6.15,5 6.35,4 6.55,5 ; 6.15,5 6.15,3 6.55,3 6.55,5 ; 6.15,5 6.55,5 ; 16.31,-5 16.51,-4 16.71,-5 ; 16.31,-5 16.31,-3 16.71,-3 16.71,-5 ; 16.31,-5 16.71,-5 ; 16.31,5 16.51,4 16.71,5 ; 16.31,5 16.31,3 16.71,3 16.71,5 ; 16.31,5 16.71,5 ; 16.945,-5 17.145,-4 17.345,-5 ; 16.945,-5 16.945,-3 17.345,-3 17.345,-5 ; 16.945,-5 17.345,-5 ; 16.945,5 17.145,4 17.345,5 ; 16.945,5 16.945,3 17.345,3 17.345,5 ; 16.945,5 17.345,5
Mechanical 14:
  lines w0.1: -19.045,-0.77 -18.915,-0.77 -18.915,0.77 -19.045,0.77 ; 17.688,-2.65 18.495,-2.65 ; 18.495,2.216 18.495,-2.725 18.97,-3.2 17.688,-3.2 17.688,3.023 19.045,1.666 ; -19.045,-3.7 19.045,-3.7 19.045,2.5 17.845,3.7 -17.845,3.7 -19.045,2.5 -19.045,-3.7
Mechanical 15:
  lines w0.05: -19.295,-5.25 19.295,-5.25 19.295,5.25 -19.295,5.25 -19.295,-5.25
3D body: height 5.77, standoff -1.05, extent -19.045,-4.55 19.045,4.55

## SAMTEC_MHDMR-19-02-H-TH-L-TR [mm] "19 Contacts, Pitch 0.4mm, Right Angle, Mini  HDMI High Speed I/O Receptacle"
height 3.2
pads (23):
  rect 0.24x2.05 smd: 1(3.6,0) 2(3.2,0) 3(2.8,0) 4(2.4,0) 5(2,0) 6(1.6,0) 7(1.2,0) 8(0.8,0) 9(0.4,0) 10(0,0) 11(-0.4,0) 12(-0.8,0) 13(-1.2,0) 14(-1.6,0) 15(-2,0) 16(-2.4,0) 17(-2.8,0) 18(-3.2,0) 19(-3.6,0)
  oval 1.32x1.96 hole 0.62 slot 1.26 at 90 deg: SHIELD(-5.425,-5.281) SHIELD(5.423,-5.281)
  oval 1.22x2.14 hole 0.62 slot 1.44 at 90 deg: SHIELD(-5.425,-0.83) SHIELD(5.423,-0.83)
Top Overlay:
  circle w0.25: c4.425,0.5 r0.125
  lines w0.2: -5.6,-6.5 -5.6,-7.33 5.599,-7.33 5.599,-6.5 ; -5.6,-4 -5.6,-2.2 ; -4.6,0.036 -4.199,0.036 ; -3.904,-5.999 ccw(c-3.905,-5.904) -3.82,-5.947 -3.82,-5.937 -3.594,-3.459 cw(c-3.485,-3.474) -3.58,-3.42 cw(c-3.417,-3.562) -3.416,-3.345 -2.814,-3.345 cw(c-2.813,-3.562) -2.65,-3.42 cw(c-2.745,-3.474) -2.636,-3.459 ; -2.636,-3.46 -2.481,-5.473 -2.481,-5.905 ccw(c-2.387,-5.905) -2.4,-5.998 ; 2.322,-5.999 ccw(c2.322,-5.904) 2.407,-5.947 2.407,-5.937 2.633,-3.459 cw(c2.742,-3.474) 2.646,-3.42 cw(c2.81,-3.562) 2.811,-3.345 3.412,-3.345 cw(c3.413,-3.562) 3.577,-3.42 cw(c3.482,-3.474) 3.59,-3.459 ; 3.59,-3.46 3.746,-5.473 3.746,-5.905 ccw(c3.84,-5.905) 3.827,-5.998 ; 4.201,0.036 4.6,0.036 ; 5.599,-4 5.599,-2.2 ; -4.006,-5.897 ccw(c-3.912,-5.905) -3.912,-5.999 -2.316,-5.999 ccw(c-2.316,-5.905) -2.222,-5.897 -2.468,-3.093 ccw(c-2.57,-3.102) -2.57,-2.999 -3.658,-2.999 ccw(c-3.658,-3.102) -3.761,-3.093 -4.006,-5.897 ; 2.221,-5.897 ccw(c2.314,-5.905) 2.314,-5.999 3.911,-5.999 ccw(c3.911,-5.905) 4.004,-5.897 3.759,-3.093 ccw(c3.657,-3.102) 3.657,-2.999 2.568,-2.999 ccw(c2.568,-3.102) 2.466,-3.093 2.221,-5.897
Mechanical 7:
  lines w0.1: -3.699,-0.719 -3.699,-0.71
Mechanical 8:
  lines w0.1: -5.925,-5.68 -5.425,-5.68 -4.925,-5.68 ; -5.925,-5.281 -5.425,-5.281 -4.925,-5.281 ; -5.925,-4.88 -5.425,-4.88 -4.925,-4.88 ; -5.925,-1.28 -5.425,-1.28 -4.925,-1.28 ; -5.925,-0.83 -5.425,-0.83 -4.925,-0.83 ; -5.925,-0.38 -5.425,-0.38 -4.925,-0.38 ; -5.425,-6.18 -5.425,-4.38 ; -5.425,-1.78 -5.425,0.12 ; -4.1,0 -3.6,0 ; -3.6,-0.5 -3.6,0 ; -3.6,0.5 -3.6,0 ; -3.2,-0.5 -3.2,0 ; -3.2,0.5 -3.2,0 ; -2.8,-0.5 -2.8,0 ; -2.8,0.5 -2.8,0 ; -2.4,-0.5 -2.4,0 ; -2.4,0.5 -2.4,0 ; -2,-0.5 -2,0 ; -2,0.5 -2,0 ; -1.6,-0.5 -1.6,0 ; -1.6,0.5 -1.6,0 ; -1.2,-0.5 -1.2,0 ; -1.2,0.5 -1.2,0 ; -0.8,-0.5 -0.8,0 ; -0.8,0.5 -0.8,0 ; -0.4,-0.5 -0.4,0 ; -0.4,0.5 -0.4,0 ; 0,-0.5 0,0 ; 0,0.5 0,0 ; 0.4,-0.5 0.4,0 ; 0.4,0.5 0.4,0 ; 0.8,-0.5 0.8,0 ; 0.8,0.5 0.8,0 ; 1.2,-0.5 1.2,0 ; 1.2,0.5 1.2,0 ; 1.6,-0.5 1.6,0 ; 1.6,0.5 1.6,0 ; 2,-0.5 2,0 ; 2,0.5 2,0 ; 2.4,-0.5 2.4,0 ; 2.4,0.5 2.4,0 ; 2.8,-0.5 2.8,0 ; 2.8,0.5 2.8,0 ; 3.2,-0.5 3.2,0 ; 3.2,0.5 3.2,0 ; 3.6,-0.5 3.6,0 ; 3.6,0.5 3.6,0 ; 4.1,0 3.6,0 ; 4.923,-5.281 5.423,-5.281 5.923,-5.281 ; 4.923,-0.83 5.423,-0.83 5.923,-0.83 ; 4.925,-5.68 5.425,-5.68 5.925,-5.68 ; 4.925,-4.88 5.425,-4.88 5.925,-4.88 ; 4.925,-1.28 5.425,-1.28 5.925,-1.28 ; 4.925,-0.38 5.425,-0.38 5.925,-0.38 ; 5.425,-6.18 5.425,-4.38 ; 5.425,-1.78 5.425,0.12 ; -3.6,0 -3.2,0 ; -3.2,0 -2.8,0 ; -2.8,0 -2.4,0 ; -2.4,0 -2,0 ; -2,0 -1.6,0 ; -1.6,0 -1.2,0 ; -1.2,0 -0.8,0 ; -0.8,0 -0.4,0 ; -0.4,0 0,0 ; 0,0 0.4,0 ; 0.4,0 0.8,0 ; 0.8,0 1.2,0 ; 1.2,0 1.6,0 ; 1.6,0 2,0 ; 2,0 2.4,0 ; 2.4,0 2.8,0 ; 2.8,0 3.2,0 ; 3.2,0 3.6,0
Mechanical 14:
  circle w0.1: c4.425,0.5 r0.2
  lines w0.1: -5.345,-0.33 -5.345,0.036 5.343,0.036 5.343,-0.33 ; -3.904,-5.999 ccw(c-3.905,-5.904) -3.82,-5.947 -3.82,-5.937 -3.594,-3.459 cw(c-3.485,-3.474) -3.58,-3.42 cw(c-3.417,-3.562) -3.416,-3.345 -2.814,-3.345 cw(c-2.813,-3.562) -2.65,-3.42 cw(c-2.745,-3.474) -2.636,-3.459 ; -3.699,0.036 -3.699,0.871 -3.499,0.871 -3.499,0.036 ; -3.449,-0.33 -3.449,-1.031 ccw(c-3.149,-1.031) -2.849,-1.031 -2.849,-0.33 ; -3.299,0.036 -3.299,0.871 -3.099,0.871 -3.099,0.036 ; -2.899,0.036 -2.899,0.871 -2.699,0.871 -2.699,0.036 ; -2.636,-3.46 -2.481,-5.473 -2.481,-5.905 ccw(c-2.387,-5.905) -2.4,-5.998 ; -2.499,0.036 -2.499,0.871 -2.299,0.871 -2.299,0.036 ; -2.099,0.036 -2.099,0.871 -1.899,0.871 -1.899,0.036 ; -1.699,0.036 -1.699,0.871 -1.499,0.871 -1.499,0.036 ; -1.299,0.036 -1.299,0.871 -1.099,0.871 -1.099,0.036 ; -0.899,0.036 -0.899,0.871 -0.699,0.871 -0.699,0.036 ; -0.501,-0.783 0.499,-0.783 ; -0.501,-0.651 0.499,-0.651 ; -0.499,-0.614 -0.499,-1.531 0.499,-1.531 0.501,-0.614 ; -0.499,0.036 -0.499,0.871 -0.299,0.871 -0.299,0.036 ; -0.099,0.036 -0.099,0.871 0.101,0.871 0.101,0.036 ; 0.301,0.036 0.301,0.871 0.501,0.871 0.501,0.036 ; 0.701,0.036 0.701,0.871 0.901,0.871 0.901,0.036 ; 1.101,0.036 1.101,0.871 1.301,0.871 1.301,0.036 ; 1.501,0.036 1.501,0.871 1.701,0.871 1.701,0.036 ; 1.901,0.036 1.901,0.871 2.101,0.871 2.101,0.036 ; 2.301,0.036 2.301,0.871 2.501,0.871 2.501,0.036 ; 2.322,-5.999 ccw(c2.322,-5.904) 2.407,-5.947 2.407,-5.937 2.633,-3.459 cw(c2.742,-3.474) 2.646,-3.42 cw(c2.81,-3.562) 2.811,-3.345 3.412,-3.345 cw(c3.413,-3.562) 3.577,-3.42 cw(c3.482,-3.474) 3.59,-3.459 ; 2.701,0.036 2.701,0.871 2.901,0.871 2.901,0.036 ; 2.848,-0.33 2.848,-1.031 ccw(c3.148,-1.031) 3.447,-1.031 3.447,-0.33 ; 3.101,0.036 3.101,0.871 3.301,0.871 3.301,0.036 ; 3.501,0.036 3.501,0.871 3.701,0.871 3.701,0.036 ; 3.59,-3.46 3.746,-5.473 3.746,-5.905 ccw(c3.84,-5.905) 3.827,-5.998 ; -5.6,-7.33 -5.6,-0.33 5.599,-0.33 5.599,-7.33 -5.6,-7.33 ; -5.576,-5.755 -5.576,-4.104 -4.598,-4.104 -4.598,-5.755 -5.576,-5.755 ; -4.006,-5.897 ccw(c-3.912,-5.905) -3.912,-5.999 -2.316,-5.999 ccw(c-2.316,-5.905) -2.222,-5.897 -2.468,-3.093 ccw(c-2.57,-3.102) -2.57,-2.999 -3.658,-2.999 ccw(c-3.658,-3.102) -3.761,-3.093 -4.006,-5.897 ; 2.221,-5.897 ccw(c2.314,-5.905) 2.314,-5.999 3.911,-5.999 ccw(c3.911,-5.905) 4.004,-5.897 3.759,-3.093 ccw(c3.657,-3.102) 3.657,-2.999 2.568,-2.999 ccw(c2.568,-3.102) 2.466,-3.093 2.221,-5.897 ; 4.597,-5.755 4.597,-4.104 5.575,-4.104 5.575,-5.755 4.597,-5.755
3D body: height 3.28, standoff -0.92, extent -5.74,-7.33 5.738,0.871

## SAMTEC_MLE-107-01-G-DV-A [mm] "12 Contacts - Pitch 1mm - Top Entry, Dual Row Surface Mount Receptacle"
height 3.5
pads (16):
  rect 0.61x1.709 smd: 1(-3,1.686) 2(-3,-1.686) 3(-2,1.686) 4(-2,-1.686) 5(-1,1.686) 6(-1,-1.686) 7(0,1.686) 8(0,-1.686) 9(1,1.686) 10(1,-1.686) 11(2,1.686) 12(2,-1.686) 13(3,1.686) 14(3,-1.686)
  round 0.5 hole 0.7 unplated mask+0.1: 15(-2.5,0) 15(2.5,0)
Top Overlay:
  circle w0.25: c-3.987,2.606 r0.125
  circle w0.25: c-3.987,2.606 r0.125
  lines w0.2: -3.6,-0.431 -3.6,0.431 ; 3.6,-0.431 3.6,0.431
Mechanical 8:
  circle w0.1: c-2.5,0 r0.35
  circle w0.1: c2.5,0 r0.35
  lines w0.1: -3,-1.186 -3,-1.686 -2.5,-1.686 ; -3,0 -2.5,0 ; -3,2.186 -3,1.686 -2.5,1.686 ; -2.5,-0.5 -2.5,0 ; -2.5,0.5 -2.5,0 ; -2,-1.186 -2,-1.686 -1.5,-1.686 ; -2,0 -2.5,0 ; -2,2.186 -2,1.686 -1.5,1.686 ; -1,-1.186 -1,-1.686 -0.5,-1.686 ; -1,2.186 -1,1.686 -0.5,1.686 ; -0.5,0 0,0 ; 0,-1.186 0,-1.686 0.5,-1.686 ; 0,-0.5 0,0 ; 0,0.5 0,0 ; 0,2.186 0,1.686 0.5,1.686 ; 0.5,0 0,0 ; 1,-1.186 1,-1.686 1.5,-1.686 ; 1,2.186 1,1.686 1.5,1.686 ; 2,-1.186 2,-1.686 2.5,-1.686 ; 2,0 2.5,0 ; 2,2.186 2,1.686 2.5,1.686 ; 2.5,-0.5 2.5,0 ; 2.5,0.5 2.5,0 ; 3,-1.186 3,-1.686 3.5,-1.686 ; 3,0 2.5,0 ; 3,2.186 3,1.686 3.5,1.686 ; -3.305,-2.54 -3.305,-0.831 -2.695,-0.831 -2.695,-2.54 -3.305,-2.54 ; -3.305,0.831 -3.305,2.54 -2.695,2.54 -2.695,0.831 -3.305,0.831 ; -2.305,-2.54 -2.305,-0.831 -1.695,-0.831 -1.695,-2.54 -2.305,-2.54 ; -2.305,0.831 -2.305,2.54 -1.695,2.54 -1.695,0.831 -2.305,0.831 ; -1.305,-2.54 -1.305,-0.831 -0.695,-0.831 -0.695,-2.54 -1.305,-2.54 ; -1.305,0.831 -1.305,2.54 -0.695,2.54 -0.695,0.831 -1.305,0.831 ; -0.305,-2.54 -0.305,-0.831 0.305,-0.831 0.305,-2.54 -0.305,-2.54 ; -0.305,0.831 -0.305,2.54 0.305,2.54 0.305,0.831 -0.305,0.831 ; 0.695,-2.54 0.695,-0.831 1.305,-0.831 1.305,-2.54 0.695,-2.54 ; 0.695,0.831 0.695,2.54 1.305,2.54 1.305,0.831 0.695,0.831 ; 1.695,-2.54 1.695,-0.831 2.305,-0.831 2.305,-2.54 1.695,-2.54 ; 1.695,0.831 1.695,2.54 2.305,2.54 2.305,0.831 1.695,0.831 ; 2.695,-2.54 2.695,-0.831 3.305,-0.831 3.305,-2.54 2.695,-2.54 ; 2.695,0.831 2.695,2.54 3.305,2.54 3.305,0.831 2.695,0.831
Mechanical 14:
  drawing of 215 lines, arcs and shapes, not listed
Mechanical 15:
  lines w0.05: -3.85,-2.79 -3.85,2.79 3.85,2.79 3.85,-2.79 -3.85,-2.79
3D body: height 3.3, standoff -0.71, extent -3.6,-2.159 3.6,2.159